# Altium footprint library LED.PcbLib: 71 footprints (part 5 of 5)
Each footprint in its own frame and in the unit in brackets; x right, y up, seen from the top. Pads: shape width x height; smd on the part's side, far side on the other; paste and mask are expansions set on the pad; w line width, h text height; cw(c..) or ccw(c..) is an arc to the next point about the centre after c.
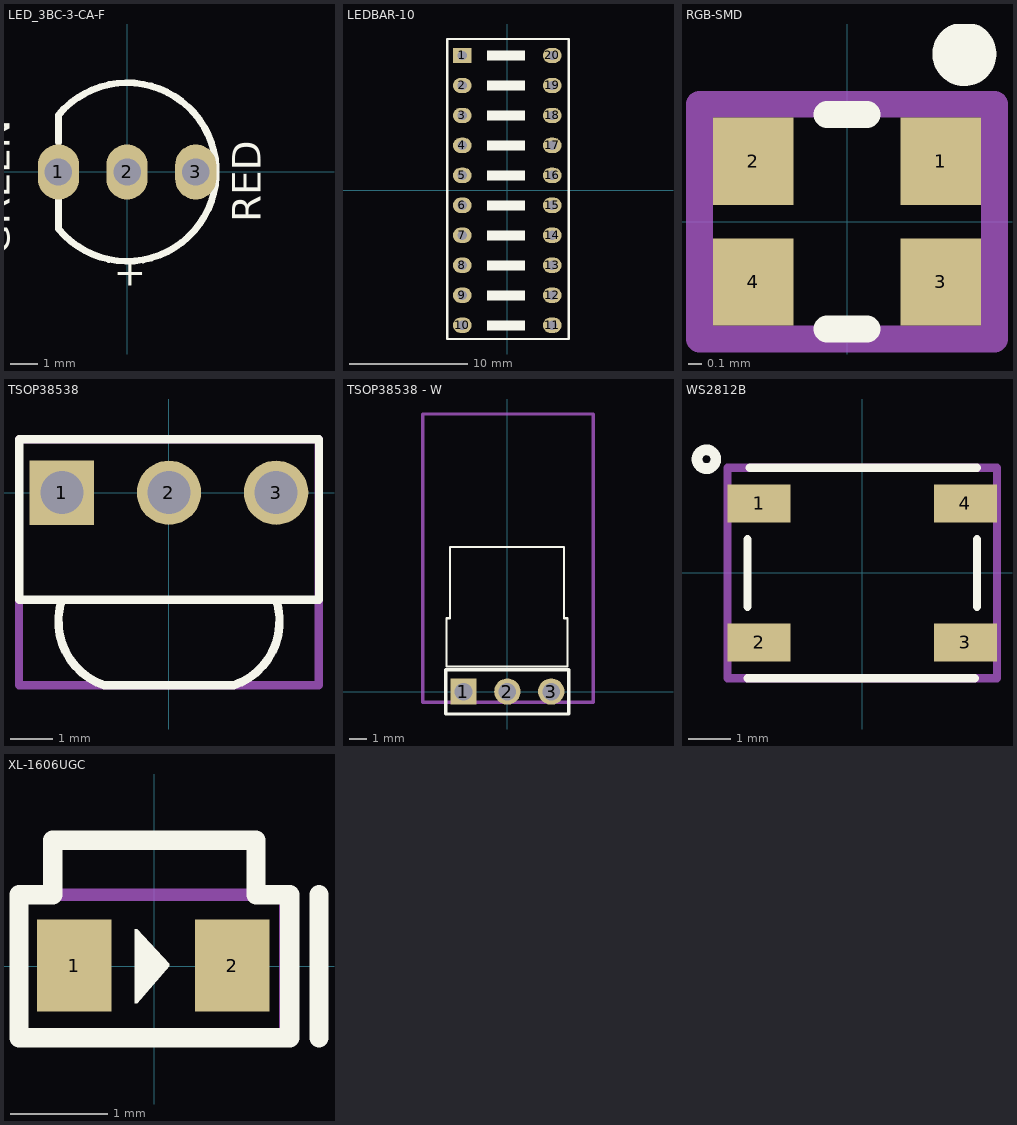
[diagram p4: the footprints below, top view; thin cyan lines are the x and y axes]

## LED_3BC-3-CA-F [mil]
height 53.15
pads (3):
  oval 60x80 hole 40: 1(-100,0) 2(0,0) 3(100,0)
Top Overlay:
  lines w10: -100.09,-40.09 -100.09,-82.95 ccw(c0,0) -99.95,83.13 ; -100,43 -100,81.32
  text "GREEN" at -157.48,-120.47 h70.87
  text "RED" at 208.66,-73.23 h70.87
  text "+" at -19.68,-179.53 h70.87
3D body: height 305.51, standoff 105.51, extent -99.8,-100.11 99.75,99.66
3D body: height 200, standoff 0, extent -100,-99.87 100,99.88
3D body: height 264.57, standoff 146.46, extent -58.88,-59.17 58.8,58.72
3D body: height 40, standoff 0, extent -105.21,-105.01 104.79,104.99

## LEDBAR-10 [mm]
pads (20):
  rect 1.6x1.3 hole 0.787: 1(-3.81,11.43)
  oval 1.6x1.3 hole 0.787: 2(-3.81,8.89) 3(-3.81,6.35) 4(-3.81,3.81) 5(-3.81,1.27) 6(-3.81,-1.27) 7(-3.81,-3.81) 8(-3.81,-6.35) 9(-3.81,-8.89) 10(-3.81,-11.43) 11(3.81,-11.43) 12(3.81,-8.89) 13(3.81,-6.35) 14(3.81,-3.81) 15(3.81,-1.27) 16(3.81,1.27) 17(3.81,3.81) 18(3.81,6.35) 19(3.81,8.89) 20(3.81,11.43)
Top Overlay:
  region: -1.689,-11.049 -1.689,-11.836 1.486,-11.836 1.486,-11.049
  region: -1.689,-8.509 -1.689,-9.296 1.486,-9.296 1.486,-8.509
  region: -1.689,-5.969 -1.689,-6.756 1.486,-6.756 1.486,-5.969
  region: -1.689,-3.429 -1.689,-4.216 1.486,-4.216 1.486,-3.429
  region: -1.689,-0.889 -1.689,-1.676 1.486,-1.676 1.486,-0.889
  region: -1.689,1.651 -1.689,0.864 1.486,0.864 1.486,1.651
  region: -1.689,4.191 -1.689,3.404 1.486,3.404 1.486,4.191
  region: -1.689,6.731 -1.689,5.944 1.486,5.944 1.486,6.731
  region: -1.689,9.271 -1.689,8.484 1.486,8.484 1.486,9.271
  region: -1.689,11.811 -1.689,11.024 1.486,11.024 1.486,11.811
  lines w0.2: -5.08,-12.598 -5.08,12.827 5.207,12.827 5.207,-12.598 -5.08,-12.598
3D body "User Library-LED_BAR_10.step": height 6.8, standoff -7, extent -5.055,-12.598 5.105,12.802

## RGB-SMD [mm]
pads (4):
  rect 0.6x0.65 smd: 1(0.7,0.45) 2(-0.7,0.45) 3(0.7,-0.45) 4(-0.7,-0.45)
Top Overlay:
  circle w0.254: c0.875,1.25 r0.112
  lines w0.2: -0.15,-0.8 0.15,-0.8 ; -0.15,0.8 0.15,0.8
Mechanical 13:
  lines w0.2: -1.1,-0.875 1.1,-0.875 1.1,0.875 -1.1,0.875 -1.1,-0.875
  text ".Designator" at -1.1,-0.311 h1
Mechanical 15:
  lines w0.2: -1.1,-0.875 1.1,-0.875 1.1,0.875 -1.1,0.875 -1.1,-0.875
  text ".Comment" at -1.1,-0.314 h1
3D body "EAST1616RGBA0.STEP": height 0.46, standoff -0.05, extent -0.8,-0.8 0.8,0.8

## TSOP38538 [mil]
pads (3):
  rect 60x60 hole 40: 1(-100,0)
  round 60 hole 40: 2(0,0) 3(100,0)
Top Overlay:
  lines w7.87: -100,-100 ccw(c-40,-120) -60,-180 60,-180 ccw(c40,-120) 100,-100 ; -139.97,-100 140.03,-100 140.03,50 -139.97,50 -139.97,-100
Mechanical 13:
  lines w7.87: -140,-180 140,-180 140,50 -140,50 -140,-180
  text ".Designator" at -100,-70 h39.37
Mechanical 15:
  lines w7.87: -140,-180 -140,50 140,50 140,-180 -140,-180
  text ".Comment" at -100,-70 h39.37
3D body "STEP_infrared_receptor_PCB.STEP": height 354.33, standoff -374.02, extent -135.8,-178.35 135.86,50

## TSOP38538 - W [mil]
pads (3):
  rect 60x60 hole 40: 1(-100,0)
  round 60 hole 40: 2(0,0) 3(100,0)
Top Overlay:
  lines w5: -138.62,57.09 -138.62,167.32 -130.74,167.32 -130.74,329.72 129.1,329.72 129.1,167.32 136.97,167.32 136.97,57.09 -138.62,57.09
  lines w7.87: -139.97,-51.18 -139.97,50 140.03,50 140.03,-51.18 -139.97,-51.18
Mechanical 13:
  lines w7.87: -192.91,-24.61 -192.91,632.87 195.87,632.87 195.87,-24.61 -192.91,-24.61
  text ".Designator" at -100,-70 h39.37
Mechanical 15:
  lines w7.87: -192.91,-24.61 195.87,-24.61 195.87,632.87 -192.91,632.87 -192.91,-24.61
  text ".Comment" at -100,-70 h39.37
3D body "IR1838.STEP": height 177.17, standoff -541.34, extent -123.98,-9.65 124.05,325.6

## WS2812B [mm]
pads (4):
  rect 1.5x0.9 smd: 1(-2.45,1.65) 2(-2.45,-1.65) 3(2.45,-1.65) 4(2.45,1.65)
Top Overlay:
  circle w0.254: c-3.7,2.7 r0.224
  lines w0.2: -2.725,-2.5 2.675,-2.5 ; -2.725,-0.8 -2.725,0.8 ; -2.675,2.5 2.725,2.5 ; 2.725,-0.8 2.725,0.8
Mechanical 13:
  lines w0.2: -3.2,-2.5 3.2,-2.5 3.2,2.5 -3.2,2.5 -3.2,-2.5
  text ".Designator" at -1,-0.5 h1.5
3D body "User Library-ws2812B-1.STEP": height 1.55, standoff -0.02, extent -2.675,-2.5 2.725,2.5

## XL-1606UGC [mm]
pads (2):
  rect 0.77x0.95 smd: 1(-0.824,0.007) 2(0.806,0.007)
Top Overlay:
  region: -0.2,0.381 -0.175,0.381 0.156,0.025 0.156,0 -0.175,-0.381 -0.2,-0.381
  lines w0.2: 1.7,-0.737 1.7,0.737 ; -1.394,-0.737 -1.394,0.737 -1.044,0.737 -1.044,1.3 1.05,1.3 1.05,0.737 1.4,0.737 1.4,-0.737 -1.394,-0.737
Mechanical 13:
  lines w0.127: -1.394,-0.736 1.349,-0.736 1.349,0.737 -1.394,0.737 -1.394,-0.736
  text ".Designator" at -1.432,-0.21 h0.8
Mechanical 15:
  lines w0.127: -1.394,-0.736 1.349,-0.736 1.349,0.737 -1.394,0.737 -1.394,-0.736
  text ".Comment" at -1.422,-0.19 h0.8
3D body "User Library-LED_0603_G.STEP": height 0.6, standoff 0, extent -0.822,0.337 0.778,1.137